# Altium footprint library IC.PCBLIB: 359 footprints (part 17 of 23)
Each footprint in its own frame and in the unit in brackets; x right, y up, seen from the top. Pads: shape width x height; smd on the part's side, far side on the other; paste and mask are expansions set on the pad; w line width, h text height; cw(c..) or ccw(c..) is an arc to the next point about the centre after c.
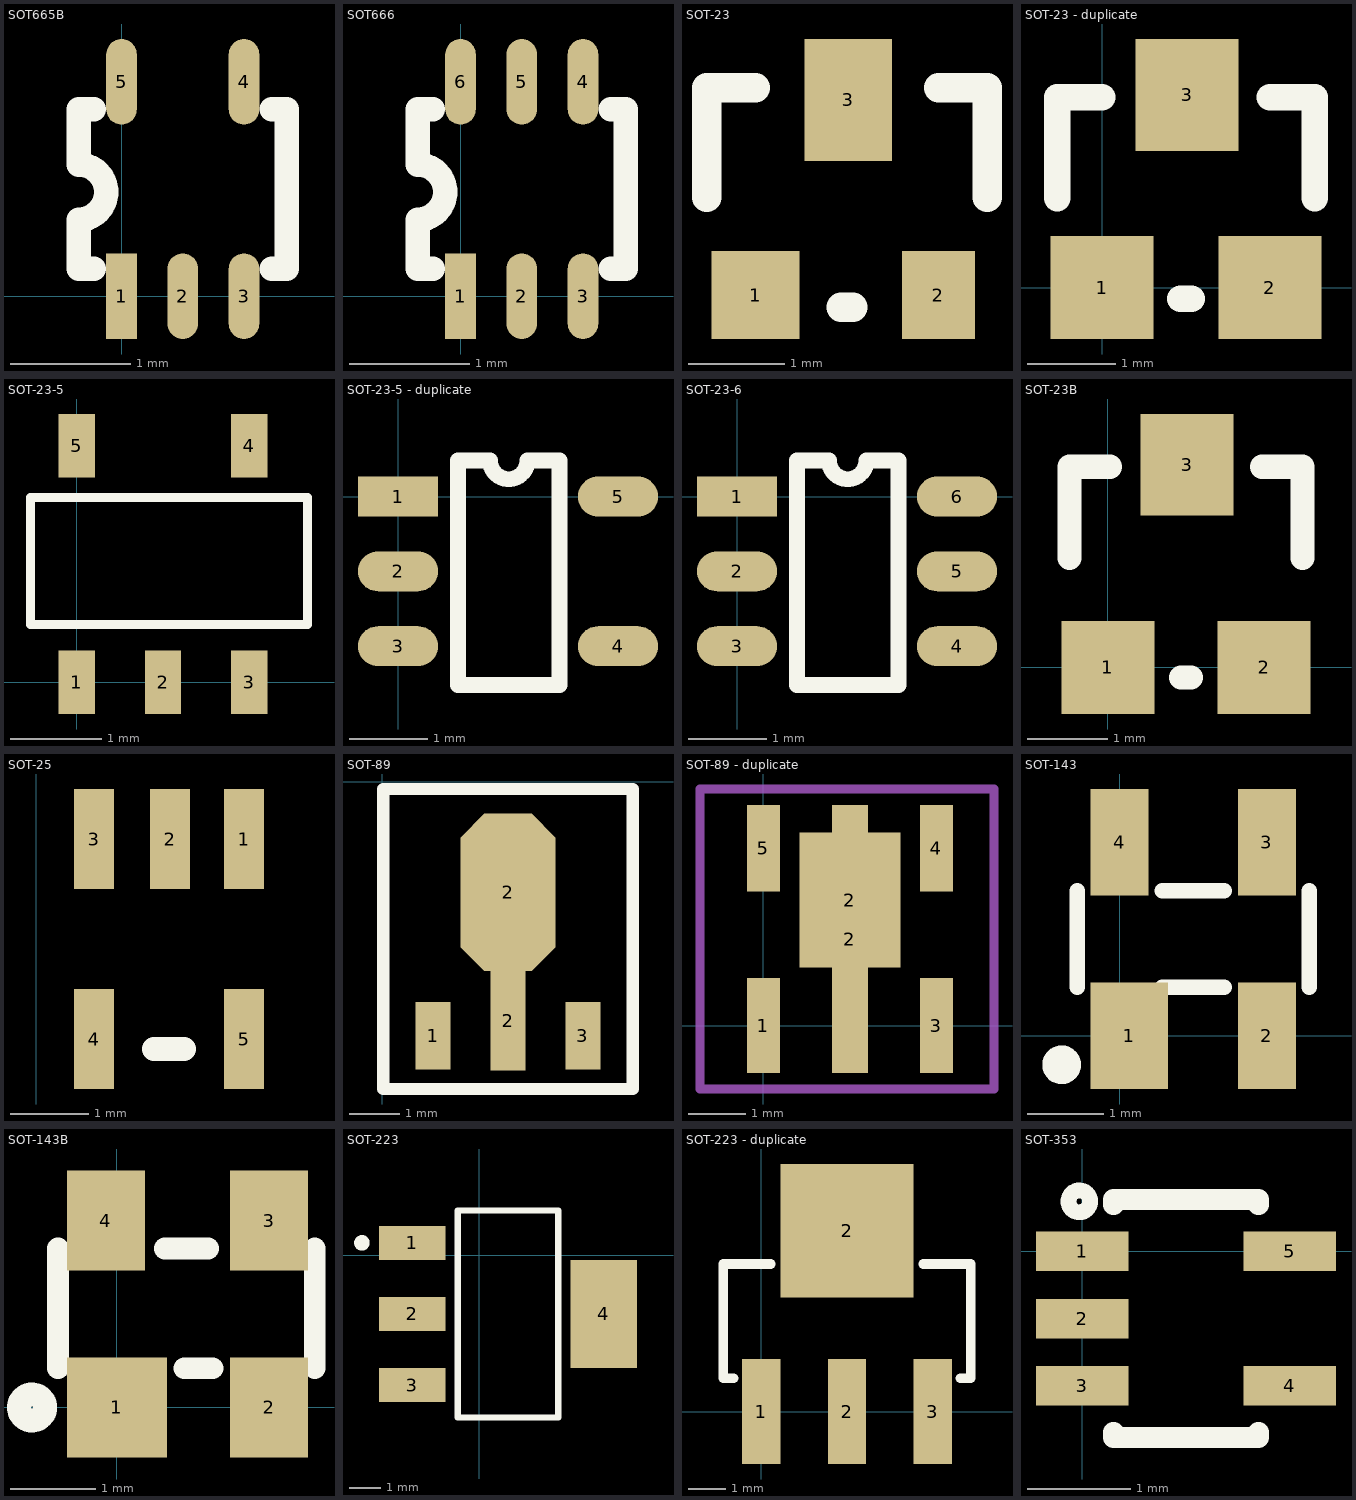
[diagram p16: the footprints below, top view; thin cyan lines are the x and y axes]

## SOT665B [mil]
pads (5):
  rect 10x28 smd: 1(0,0)
  oval 10x28 smd: 2(20,0) 3(40,0) 4(40,70) 5(0,70)
TopOverlay:
  lines w8: -9,9 -14,9 -14,25 ccw(c-14,34) -14,43 -14,61 -9,61 ; 49,9 54,9 54,61 49,61

## SOT666 [mil]
pads (6):
  rect 10x28 smd: 1(0,0)
  oval 10x28 smd: 2(20,0) 3(40,0) 4(40,70) 5(20,70) 6(0,70)
TopOverlay:
  lines w8: -9,9 -14,9 -14,25 ccw(c-14,34) -14,43 -14,61 -9,61 ; 49,9 54,9 54,61 49,61

## SOT-23 [mil]
pads (3):
  rect 36x36 smd: 1(47.76,-120.28)
  rect 30x36 smd: 2(122.75,-120.28)
  rect 36x50 smd: 3(85.75,-40.28)
TopOverlay:
  lines w12: 27.75,-80.28 27.75,-35.28 47.76,-35.28 ; 82.75,-125.28 87.75,-125.28 ; 122.75,-35.28 142.75,-35.28 142.75,-80.28

## SOT-23 - duplicate [mil]
pads (3):
  rect 46x46 smd: 1(0,0) 2(75,0)
  rect 46x50 smd: 3(38,86)
TopOverlay:
  lines w12: -20,40 -20,85 0,85 ; 35,-5 40,-5 ; 75,85 95,85 95,40

## SOT-23-5 [mm]
pads (5):
  rect 0.4x0.7 smd: 1(0,0) 2(0.95,0) 3(1.9,0) 4(1.9,2.6) 5(0,2.6)
TopOverlay:
  lines w0.1: -0.508,0.635 -0.508,2.032 2.54,2.032 2.54,0.635 -0.508,0.635

## SOT-23-5 - duplicate [mil]
pads (5):
  rect 40x20 smd: 1(0,0)
  oval 40x20 smd: 2(0,-37.4) 3(0,-74.8) 4(110,-74.8) 5(110,0)
TopOverlay:
  lines w7.87: 30,18 30,-94.2 80.7,-94.2 80.7,18 ; 46,18 ccw(c55.35,18) 64.7,18
  lines w8: 30,18 46,18 ; 64.7,18 80.7,18

## SOT-23-6 [mil]
pads (6):
  rect 40x20 smd: 1(0,0)
  oval 40x20 smd: 2(0,-37.4) 3(0,-74.8) 4(110,-74.8) 5(110,-37.4) 6(110,0)
TopOverlay:
  lines w7.87: 30,18 30,-94.2 80.7,-94.2 80.7,18 ; 46,18 ccw(c55.35,18) 64.7,18
  lines w8: 30,18 46,18 ; 64.7,18 80.7,18

## SOT-23B [mil]
pads (3):
  rect 46x46 smd: 1(0,0) 2(77,0)
  rect 46x50 smd: 3(39,100)
TopOverlay:
  lines w12: -19,54 -19,99 1,99 ; 36,-5 41,-5 ; 76,99 96,99 96,54

## SOT-25 [mil]
pads (5):
  rect 20x50 smd: 1(104,-40) 2(67,-40) 3(29,-40) 4(29,-140) 5(104,-140)
TopOverlay:
  lines w12: 59,-145 74,-145

## SOT-89 [mm]
pads (4):
  rect 0.7x1.35 smd: 1(1.016,-5.08) 3(4.016,-5.08)
  rect 0.7x1.99 smd: 2(2.516,-4.785)
  oct 1.9x3.15 smd: 2(2.516,-2.215)
TopOverlay:
  lines w0.25: 0.016,-6.148 0.016,-0.147 5.016,-0.147 5.016,-6.148 0.016,-6.148

## SOT-89 - duplicate [mm]
pads (6):
  rect 0.57x1.65 smd: 1(0,0) 3(3,0)
  rect 0.62x4.65 smd: 2(1.5,1.5)
  rect 1.75x2.34 smd: 2(1.5,2.175)
  rect 0.57x1.5 smd: 4(3,3.075) 5(0,3.075)
Mechanical15:
  lines w0.152: -1.1,-1.1 -1.1,-1 -1.1,4 -1.1,4.1 4,4.1 4,-1.1 -1.1,-1.1
3D body: height 1.6, standoff 0, extent -0.8,0.3 3.8,2.9

## SOT-143 [mil]
pads (4):
  rect 40x55 smd: 1(5,0)
  rect 30x55 smd: 2(76,0) 3(76,100) 4(0,100)
TopOverlay:
  circle w10: c-30,-15 r5
  lines w8: -22,25 -22,75 ; 22,25 54,25 ; 22,75 54,75 ; 98,25 98,75

## SOT-143B [mil]
pads (4):
  rect 46x46 smd: 1(0,0)
  rect 36x46 smd: 2(70,0) 3(70,86) 4(-5,86)
TopOverlay:
  circle w11: c-39,0 r6
  lines w10: -27.11,18 -27.11,73.12 ; 22,73.12 42,73.12 ; 31,18 44,18 ; 91,18 91,73.12

## SOT-223 [mm]
pads (4):
  rect 2.15x1.1 smd: 1(-2.166,0.405) 2(-2.166,-1.895) 3(-2.166,-4.195)
  rect 2.15x3.5 smd: 4(4.034,-1.895)
TopOverlay:
  circle w0.25: c-3.791,0.405 r0.125
  lines w0.2: -0.691,-5.245 -0.691,1.455 2.559,1.455 2.559,-5.245 -0.691,-5.245

## SOT-223 - duplicate [mil]
pads (4):
  rect 40x110 smd: 1(0,0) 2(90,0) 3(180,0)
  rect 140x140 smd: 2(90,190)
TopOverlay:
  lines w10: -29,35 -40,35 -40,155 10,155 ; 170,155 220,155 220,35 209,35

## SOT-353 [mil]
pads (5):
  rect 35.28x15 smd: 1(0,0) 2(0,-25.59) 3(0,-51.18) 4(78.9,-51.18) 5(78.9,0)
TopOverlay:
  circle w6: c-1.15,19 r4.15
  lines w7.87: 11.89,-68.9 11.89,-70.87 67.01,-70.87 67.01,-68.9 ; 11.89,17.72 11.89,19.68 67.01,19.68 67.01,17.72